# Altium footprint library SomoPowerPackControl.PcbLib: 145 footprints (part 2 of 10)
Each footprint in its own frame and in the unit in brackets; x right, y up, seen from the top. Pads: shape width x height; smd on the part's side, far side on the other; paste and mask are expansions set on the pad; w line width, h text height; cw(c..) or ccw(c..) is an arc to the next point about the centre after c.
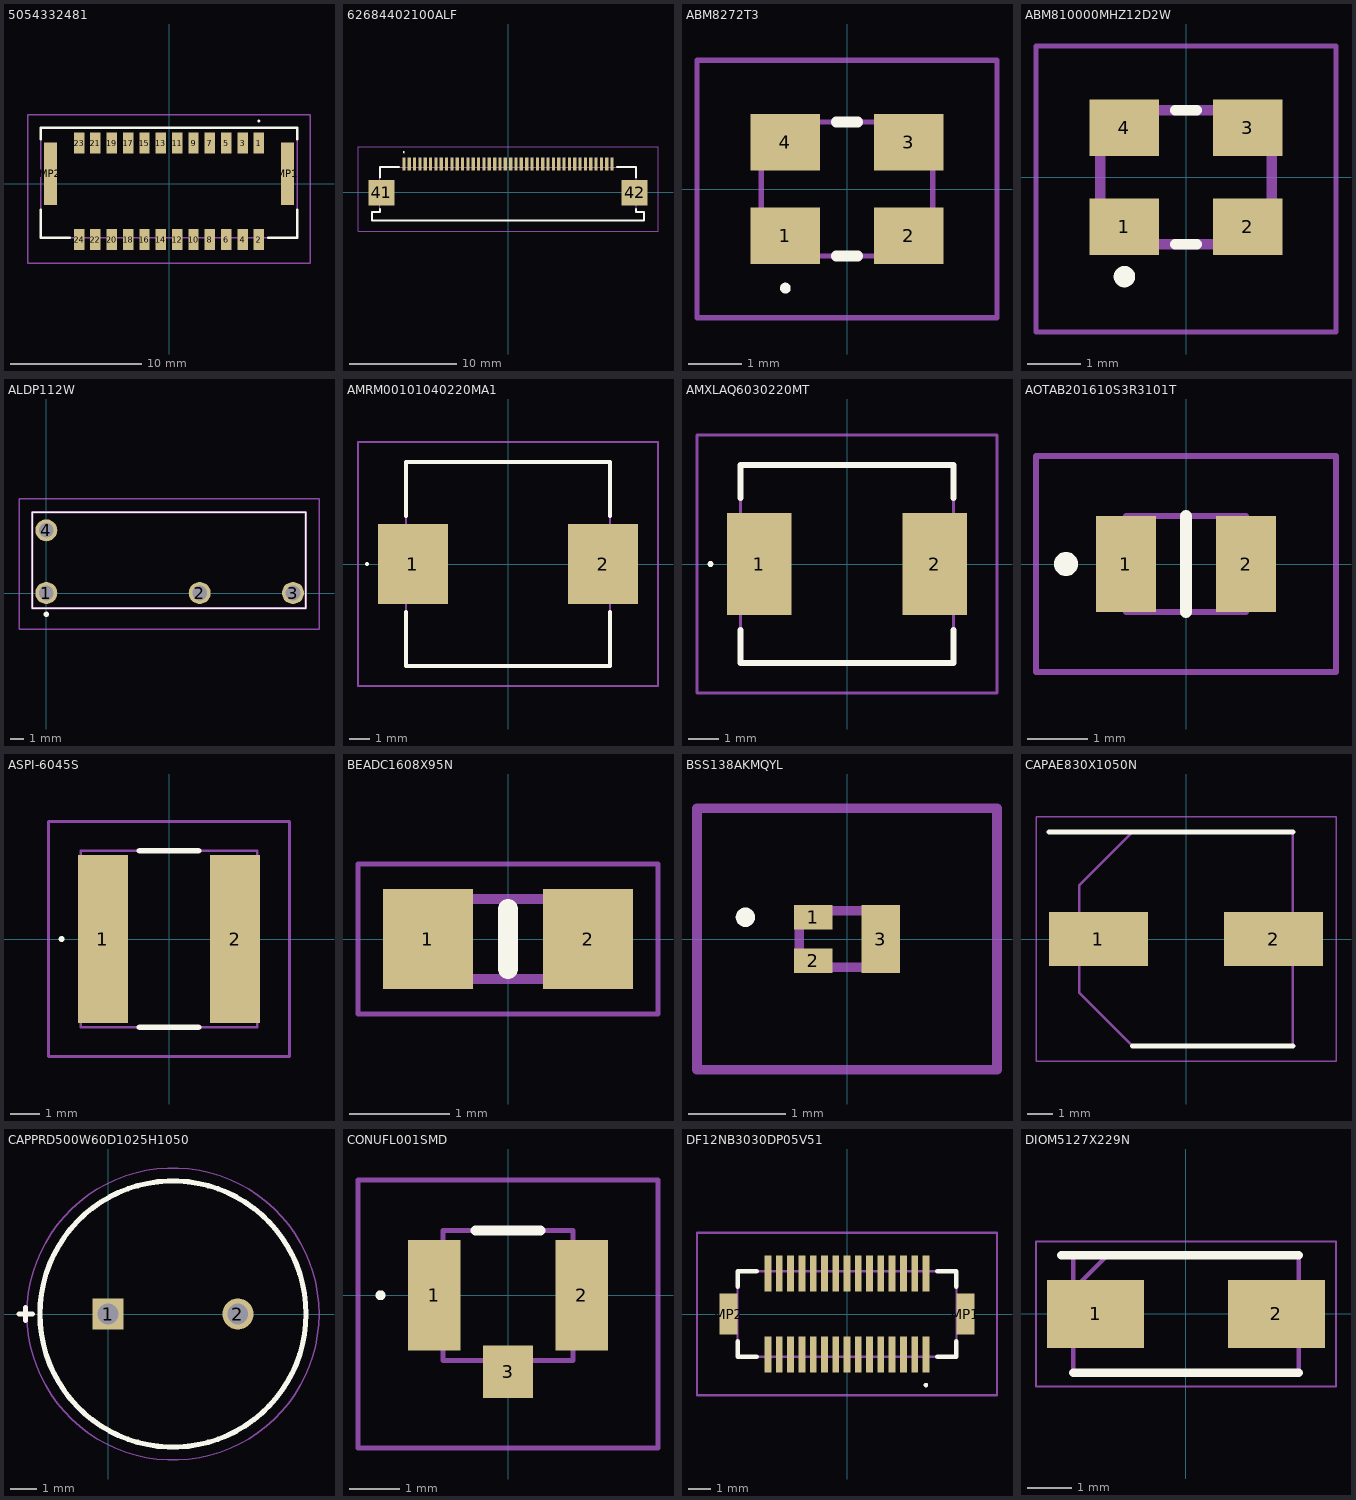
[diagram p1: the footprints below, top view; thin cyan lines are the x and y axes]

## 5054332481 [mm]
pads (26):
  rect 0.8x1.6 smd: 1(6.875,3.115) 2(6.875,-4.275) 3(5.625,3.115) 4(5.625,-4.275) 5(4.375,3.115) 6(4.375,-4.275) 7(3.125,3.115) 8(3.125,-4.275) 9(1.875,3.115) 10(1.875,-4.275) 11(0.625,3.115) 12(0.625,-4.275) 13(-0.625,3.115) 14(-0.625,-4.275) 15(-1.875,3.115) 16(-1.875,-4.275) 17(-3.125,3.115) 18(-3.125,-4.275) 19(-4.375,3.115) 20(-4.375,-4.275) 21(-5.625,3.115) 22(-5.625,-4.275) 23(-6.875,3.115) 24(-6.875,-4.275)
  rect 1x4.8 smd: MP1(9.075,0.775) MP2(-9.075,0.775)
Top Overlay:
  lines w0.1: 6.875,4.75 ccw(c6.875,4.8) 6.875,4.85 ccw(c6.875,4.8) 6.875,4.75
  lines w0.2: -9.8,-2 -9.8,-4.125 -7.6,-4.125 ; -9.8,3.4 -9.8,4.275 9.8,4.275 9.8,3.4 ; 7.6,-4.125 9.8,-4.125 9.8,-2
Mechanical 13:
  lines w0.1: -9.8,-4.125 -9.8,4.275 9.8,4.275 9.8,-4.125 -9.8,-4.125
Mechanical 15:
  lines w0.1: -10.8,-6.075 -10.8,5.275 10.8,5.275 10.8,-6.075 -10.8,-6.075
3D body "505433-2481.stp": height 7.4, standoff 0, extent -9.796,-4.93 9.804,4.12

## 62684402100ALF [mm]
pads (42):
  rect 0.3x1.2 smd: 1(-9.75,2.65) 2(-9.25,2.65) 3(-8.75,2.65) 4(-8.25,2.65) 5(-7.75,2.65) 6(-7.25,2.65) 7(-6.75,2.65) 8(-6.25,2.65) 9(-5.75,2.65) 10(-5.25,2.65) 11(-4.75,2.65) 12(-4.25,2.65) 13(-3.75,2.65) 14(-3.25,2.65) 15(-2.75,2.65) 16(-2.25,2.65) 17(-1.75,2.65) 18(-1.25,2.65) 19(-0.75,2.65) 20(-0.25,2.65) 21(0.25,2.65) 22(0.75,2.65) 23(1.25,2.65) 24(1.75,2.65) 25(2.25,2.65) 26(2.75,2.65) 27(3.25,2.65) 28(3.75,2.65) 29(4.25,2.65) 30(4.75,2.65) 31(5.25,2.65) 32(5.75,2.65) 33(6.25,2.65) 34(6.75,2.65) 35(7.25,2.65) 36(7.75,2.65) 37(8.25,2.65) 38(8.75,2.65) 39(9.25,2.65) 40(9.75,2.65)
  rect 2.4x2.4 smd: 41(-11.85,-0.05) 42(11.85,-0.05)
Top Overlay:
  lines w0.1: -9.75,3.7 cw(c-9.75,3.75) -9.75,3.8 cw(c-9.75,3.75) -9.75,3.7
  lines w0.2: -12,-1.6 -12,-1.85 -12.75,-1.85 -12.75,-2.65 12.75,-2.65 12.75,-1.85 12,-1.85 12,-1.6 ; -12,1.4 -12,2.35 -10.2,2.35 ; 10.2,2.35 12,2.35 12,1.4
Mechanical 13:
  lines w0.1: -12.75,-2.65 12.75,-2.65 12.75,-1.85 12,-1.85 12,2.35 0,2.35 -12,2.35 -12,-1.85 -12.75,-1.85 -12.75,-2.65
Mechanical 15:
  lines w0.1: -14.05,-3.65 -14.05,4.25 14.05,4.25 14.05,-3.65 -14.05,-3.65
3D body "62684-402100ALF.stp": height 0, standoff -5.6, extent -12.75,-0.05 12.75,2

## ABM8272T3 [mm]
pads (4):
  rect 1.3x1.05 smd: 1(-1.15,-0.875) 2(1.15,-0.875) 3(1.15,0.875) 4(-1.15,0.875)
Top Overlay:
  lines w0.1: -1.15,-1.9 cw(c-1.15,-1.85) -1.15,-1.8 cw(c-1.15,-1.85) -1.15,-1.9
  lines w0.2: -0.2,-1.25 0.2,-1.25 ; -0.2,1.25 0.2,1.25
Mechanical 13:
  lines w0.1: -1.6,-1.25 -1.6,1.25 1.6,1.25 1.6,-1.25 -1.6,-1.25
Mechanical 15:
  lines w0.1: -2.8,-2.4 -2.8,2.4 2.8,2.4 2.8,-2.4 -2.8,-2.4
3D body "ABM8-272-T3.stp": height 0.75, standoff 0, extent -1.6,-1.25 1.6,1.25

## ABM810000MHZ12D2W [mm]
pads (4):
  rect 1.3x1.05 smd: 1(-1.15,-0.925) 2(1.15,-0.925) 3(1.15,0.925) 4(-1.15,0.925)
Top Overlay:
  lines w0.2: -0.2,-1.25 0.2,-1.25 ; -0.2,1.25 0.2,1.25 ; -1.25,-1.854 cw(c-1.15,-1.854) -1.05,-1.854 cw(c-1.15,-1.854) -1.25,-1.854
Mechanical 13:
  lines w0.2: -1.6,-1.25 -1.6,1.25 1.6,1.25 1.6,-1.25 -1.6,-1.25
Mechanical 15:
  lines w0.1: -2.8,-2.887 -2.8,2.45 2.8,2.45 2.8,-2.887 -2.8,-2.887
3D body "ABM8-25.000MHZ-D4Y-T.stp": height 0.8, standoff 0, extent -1.6,-1.25 1.6,1.25

## ALDP112W [mm]
pads (4):
  round 1.65 hole 1.1: 1(0,0) 2(11.5,0) 3(18.5,0) 4(0,4.7)
Top Overlay:
  lines w0.1: -1.05,-1.15 -1.05,6.05 19.45,6.05 19.45,-1.15 -1.05,-1.15
  lines w0.2: -0.1,-1.6 ccw(c0,-1.6) 0.1,-1.6 ccw(c0,-1.6) -0.1,-1.6
Mechanical 13:
  lines w0.2: -1.05,-1.15 -1.05,6.05 19.45,6.05 19.45,-1.15 -1.05,-1.15
Mechanical 15:
  lines w0.1: -2.05,-2.7 -2.05,7.05 20.45,7.05 20.45,-2.7 -2.05,-2.7
3D body "ALD-P112W.stp": height 14.9, standoff -3.4, extent -1.05,-1.2 19.25,5.8

## AMRM00101040220MA1 [mm]
pads (2):
  rect 3.5x4 smd: 1(-4.75,0) 2(4.75,0)
Top Overlay:
  lines w0.1: -7.1,0 ccw(c-7.05,0) -7,0 ccw(c-7.05,0) -7.1,0
  lines w0.2: -5.1,-2.4 -5.1,-5.1 5.1,-5.1 5.1,-2.4 ; -5.1,2.4 -5.1,5.1 5.1,5.1 5.1,2.4
Mechanical 13:
  lines w0.1: -5.1,-5.1 -5.1,5.1 5.1,5.1 5.1,-5.1 -5.1,-5.1
Mechanical 15:
  lines w0.1: -7.5,-6.1 -7.5,6.1 7.5,6.1 7.5,-6.1 -7.5,-6.1
3D body "AMRM00101040220MA1.stp": height 4.1, standoff 0, extent -6.15,-5.1 6.15,5.1

## AMXLAQ6030220MT [mm]
pads (2):
  rect 2.15x3.4 smd: 1(-2.925,0) 2(2.925,0)
Top Overlay:
  lines w0.1: -4.6,0 cw(c-4.55,0) -4.5,0 cw(c-4.55,0) -4.6,0
  lines w0.2: -3.55,-2.2 -3.55,-3.3 3.55,-3.3 3.55,-2.2 ; -3.55,2.2 -3.55,3.3 3.55,3.3 3.55,2.2
Mechanical 13:
  lines w0.1: -3.55,-3.3 -3.55,3.3 3.55,3.3 3.55,-3.3 -3.55,-3.3
Mechanical 15:
  lines w0.1: -5,-4.3 -5,4.3 5,4.3 5,-4.3 -5,-4.3
3D body "AMXLA-Q6030-220M-T.stp": height 2.81, standoff 0, extent -3.65,-3.3 3.65,3.3

## AOTAB201610S3R3101T [mm]
pads (2):
  rect 1x1.6 smd: 1(-1,0) 2(1,0)
Top Overlay:
  lines w0.2: 0,-0.8 0,0.8 ; -2,-0.1 cw(c-2,0) -2,0.1 cw(c-2,0) -2,-0.1
Mechanical 13:
  lines w0.1: -1,-0.8 1,-0.8 1,0.8 -1,0.8 -1,-0.8
Mechanical 15:
  lines w0.1: -2.5,-1.8 2.5,-1.8 2.5,1.8 -2.5,1.8 -2.5,-1.8
3D body "AOTA-B201610S3R3-101-T.stp": height 1, standoff 0, extent -1,-0.8 1,0.8

## ASPI-6045S [mm]
pads (2):
  rect 1.7x5.7 smd: 1(-2.25,0) 2(2.25,0)
Top Overlay:
  lines w0.1: -3.7,0 cw(c-3.65,0) -3.6,0 cw(c-3.65,0) -3.7,0
  lines w0.2: -1,-3 1,-3 ; -1,3 1,3
Mechanical 13:
  lines w0.1: -3,-3 3,-3 3,3 -3,3 -3,-3
Mechanical 15:
  lines w0.1: -4.1,-4 4.1,-4 4.1,4 -4.1,4 -4.1,-4
3D body "ASPI-6045S-560M-T.stp": height 4.5, standoff 0, extent -3,-3 3,3

## BEADC1608X95N [mm]
pads (2):
  rect 0.9x1 smd: 1(-0.8,0) 2(0.8,0)
Top Overlay:
  lines w0.2: 0,-0.3 0,0.3
Mechanical 13:
  lines w0.1: -0.8,-0.4 -0.8,0.4 0.8,0.4 0.8,-0.4 -0.8,-0.4
Mechanical 15:
  lines w0.05: -1.5,-0.75 -1.5,0.75 1.5,0.75 1.5,-0.75 -1.5,-0.75
3D body "HH-1M1608-121JT.stp": height 0.95, standoff 0, extent -0.8,-0.4 0.8,0.4

## BSS138AKMQYL [mm]
pads (3):
  rect 0.4x0.25 smd: 1(-0.35,0.225) 2(-0.35,-0.225)
  rect 0.4x0.7 smd: 3(0.35,0)
Top Overlay:
  lines w0.1: -1.1,0.225 ccw(c-1.05,0.225) -1,0.225 ccw(c-1.05,0.225) -1.1,0.225
Mechanical 13:
  lines w0.1: -0.492,-0.293 -0.492,0.293 0.492,0.293 0.492,-0.293 -0.492,-0.293
Mechanical 15:
  lines w0.1: -1.55,-1.35 -1.55,1.35 1.55,1.35 1.55,-1.35 -1.55,-1.35
3D body "BSS138AKM-QYL.stp": height 0.6, standoff 0, extent -0.525,-0.325 0.51,0.325

## CAPAE830X1050N [mm]
pads (2):
  rect 3.85x2.1 smd: 1(-3.4,0) 2(3.4,0)
Top Overlay:
  lines w0.2: -5.325,4.15 4.15,4.15 ; -2.075,-4.15 4.15,-4.15
Mechanical 13:
  lines w0.1: -4.15,-2.075 -2.075,-4.15 4.15,-4.15 4.15,4.15 -2.075,4.15 -4.15,2.075 -4.15,-2.075
Mechanical 15:
  lines w0.05: -5.825,-4.75 -5.825,4.75 5.825,4.75 5.825,-4.75 -5.825,-4.75
3D body "EMZS350ARA471MHA0G.stp": height 10.5, standoff 0, extent -4.6,-4.25 4.6,4.25

## CAPPRD500W60D1025H1050 [mm]
pads (2):
  rect 1.2x1.2 hole 0.8: 1(0,0)
  round 1.2 hole 0.8: 2(5,0)
Top Overlay:
  circle w0.2: c2.5,0 r5.125
  lines w0.2: -3.429,0 -2.921,0 ; -3.175,-0.254 -3.175,0.254
Mechanical 13:
  circle w0.1: c2.5,0 r5.125
Mechanical 15:
  circle w0.05: c2.5,0 r5.625
3D body "400AX8.2MEFC10X9.stp": height 10.5, standoff -10, extent -2.75,-5.238 7.75,5.238

## CONUFL001SMD [mm]
pads (3):
  rect 1.05x2.2 smd: 1(-1.475,0) 2(1.475,0)
  rect 1x1.05 smd: 3(0,-1.525)
Top Overlay:
  lines w0.1: -2.6,0 cw(c-2.55,0) -2.5,0 cw(c-2.55,0) -2.6,0
  lines w0.2: -0.65,1.3 0.65,1.3
Mechanical 13:
  lines w0.1: -1.3,-1.3 1.3,-1.3 1.3,1.3 -1.3,1.3 -1.3,-1.3
Mechanical 15:
  lines w0.1: -3,-3.05 3,-3.05 3,2.3 -3,2.3 -3,-3.05
3D body "CONUFL001-SMD.stp": height 1.3, standoff 0, extent -1.5,-1.55 1.5,1.55

## DF12NB3030DP05V51 [mm]
pads (32):
  rect 0.3x1.6 smd: 1(3.5,-1.8) 2(3.5,1.8) 3(3,-1.8) 4(3,1.8) 5(2.5,-1.8) 6(2.5,1.8) 7(2,-1.8) 8(2,1.8) 9(1.5,-1.8) 10(1.5,1.8) 11(1,-1.8) 12(1,1.8) 13(0.5,-1.8) 14(0.5,1.8) 15(0,-1.8) 16(0,1.8) 17(-0.5,-1.8) 18(-0.5,1.8) 19(-1,-1.8) 20(-1,1.8) 21(-1.5,-1.8) 22(-1.5,1.8) 23(-2,-1.8) 24(-2,1.8) 25(-2.5,-1.8) 26(-2.5,1.8) 27(-3,-1.8) 28(-3,1.8) 29(-3.5,-1.8) 30(-3.5,1.8)
  rect 0.8x1.8 smd: MP1(5.25,0) MP2(-5.25,0)
Top Overlay:
  lines w0.1: 3.5,-3.2 cw(c3.5,-3.15) 3.5,-3.1 cw(c3.5,-3.15) 3.5,-3.2
  lines w0.2: -4.85,-1.2 -4.85,-1.9 -4,-1.9 ; -4.85,1.2 -4.85,1.9 -4,1.9 ; 4,-1.9 4.85,-1.9 4.85,-1.2 ; 4,1.9 4.85,1.9 4.85,1.2
Mechanical 13:
  lines w0.1: -4.85,-1.9 -4.85,1.9 4.85,1.9 4.85,-1.9 -4.85,-1.9
Mechanical 15:
  lines w0.1: -6.65,-3.6 -6.65,3.6 6.65,3.6 6.65,-3.6 -6.65,-3.6
3D body "DF12NB_3.0_-30DP-0.5V_51_.stp": height 2.3, standoff 0, extent -5.3,-2.3 5.3,2.3

## DIOM5127X229N [mm]
pads (2):
  rect 2.2x1.55 smd: 1(-2.05,0) 2(2.05,0)
Top Overlay:
  lines w0.2: -2.825,1.332 2.552,1.332 ; -2.552,-1.332 2.552,-1.332
Mechanical 13:
  lines w0.1: -2.552,0.558 -1.778,1.332 ; -2.552,-1.332 2.552,-1.332 2.552,1.332 -2.552,1.332 -2.552,-1.332
Mechanical 15:
  lines w0.05: -3.4,-1.645 3.4,-1.645 3.4,1.645 -3.4,1.645 -3.4,-1.645
3D body "SS14-M3_5AT.stp": height 2.17, standoff 0, extent -2.542,-1.336 2.551,1.329